# Altium footprint library My Library.PcbLib: 872 footprints (part 38 of 55)
Each footprint in its own frame and in the unit in brackets; x right, y up, seen from the top. Pads: shape width x height; smd on the part's side, far side on the other; paste and mask are expansions set on the pad; w line width, h text height; cw(c..) or ccw(c..) is an arc to the next point about the centre after c.
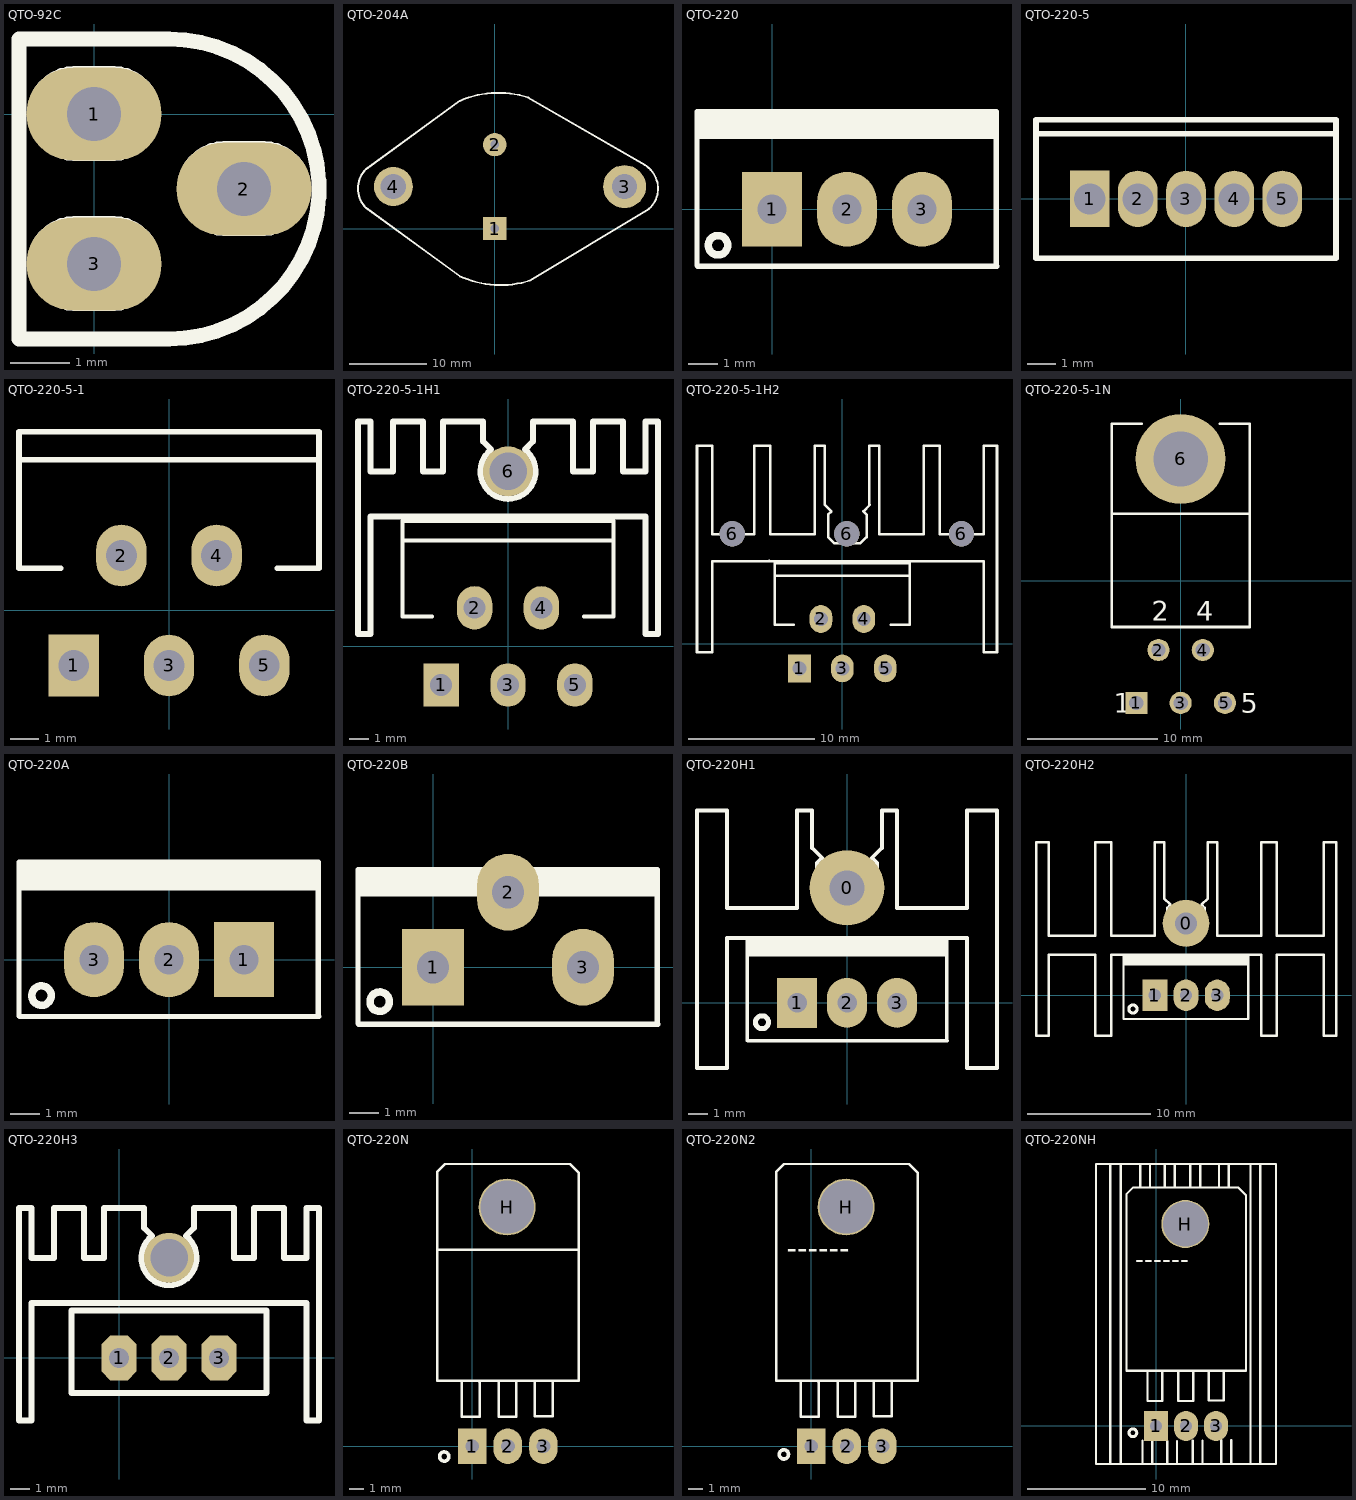
[diagram p37: the footprints below, top view; thin cyan lines are the x and y axes]

## QTO-92C [mil]
pads (3):
  oval 90x62 hole 36: 1(0,0) 2(100,-50) 3(0,-100)
Top Overlay:
  lines w10: -50,-150 -50,50 0,50 50,50 cw(c50,-50) 50,-150 0,-150 -50,-150 ; -13,-126.25 cw(c-13,-99.63) -13,-73 13,-73 cw(c13,-99.63) 13,-126.25 -13,-126.25 ; -13,-26.25 cw(c-13,0.37) -13,27 13,27 cw(c13,0.37) 13,-26.25 -13,-26.25 ; 87,-76.25 cw(c87,-49.63) 87,-23 113,-23 cw(c113,-49.63) 113,-76.25 87,-76.25

## QTO-204A [mil] "Pin For 2N3055, 2N2955"
pads (4):
  rect 120x120 hole 45: 1(0,0)
  round 120 hole 45: 2(0,430)
  round 220 hole 130: 3(665,215)
  round 200 hole 130: 4(-520,215)
Top Overlay:
  lines w10: -660,105 cw(c-560,205) -660,305 -179.46,654.16 ; -659.88,104.89 -178.69,-244.72 ; -179.53,654.34 cw(c18.37,195.17) 171.59,671.11 ; -178.9,-245.19 ccw(c28.37,209.83) 180.47,-266.47 ; 171.46,670.71 769.34,325.52 ; 180.28,-266.15 789.88,100.13 ccw(c695,205) 769.25,325.36

## QTO-220 [mil] "TO-220 - 1-2-3"
height 200
pads (3):
  rect 80x100 hole 39: 1(0,0)
  oval 80x100 hole 39: 2(100,0) 3(200,0)
Top Overlay:
  circle w10: c-72.03,-48 r12.97
  rectangle: -99,94 300,130
  lines w7: 298,107 299,93 ; -100,-75 -99,-76 -76,-76 300,-76 299,-75 299,130 -100,130 -100,-75
3D body "SW3dPS-TO220AB.STEP": height 754.72, standoff -400, extent -119,-64 322.46,120.65

## QTO-220-5 [mm] "TO, Thru-Hole, Vertical, Heatsink Mounted; 5 In-Line Leads; Pitch 1.70 mm"
height 15.6
pads (5):
  rect 1.4x2 hole 1.1: 1(-3.4,0)
  oval 1.4x2 hole 1.1: 2(-1.7,0) 3(0,0) 4(1.7,0) 5(3.4,0)
Top Overlay:
  lines w0.2: -5.3,2.3 5.3,2.3 ; -5.3,-2.1 -5.3,2.8 5.3,2.8 5.3,-2.1 -5.3,-2.1
3D body "TO220-5 v2.STEP": height 18, standoff -9.82, extent -5.08,-2.064 5.08,2.896

## QTO-220-5-1 [mm] "TO, Thru-Hole, Vertical, Heatsink Mounted; 5 Bent Staggered Leads; Pitch 1.7mm"
height 22.1
pads (5):
  rect 1.8x2.2 hole 1.1: 1(-3.4,-1.96)
  oval 1.8x2.2 hole 1.1: 2(-1.7,1.96) 3(0,-1.96) 4(1.7,1.96) 5(3.4,-1.96)
Top Overlay:
  lines w0.2: -5.35,5.38 5.35,5.38 ; -3.854,1.51 -5.35,1.51 -5.35,6.375 5.35,6.375 5.35,1.51 3.854,1.51
3D body "TO220-5-1.STEP": height 19.5, standoff -8.78, extent -5.105,-2.105 5.095,6.452

## QTO-220-5-1H1 [mm] "TO, Thru-Hole, Vertical, Heatsink Mounted; 5 Bent Staggered Leads; Pitch 1.7mm"
height 22.1
pads (6):
  rect 1.8x2.2 hole 1.1: 1(-3.4,-1.96)
  oval 1.8x2.2 hole 1.1: 2(-1.7,1.96) 3(0,-1.96) 4(1.7,1.96) 5(3.4,-1.96)
  round 2.54 hole 1.905: 6(0,8.89)
Top Overlay:
  lines w0.2: -5.35,5.38 5.35,5.38 ; -3.854,1.51 -5.35,1.51 -5.35,6.375 5.35,6.375 5.35,1.51 3.854,1.51
  lines w0.305: -0.864,10.008 -1.27,10.414 -1.27,11.43 -3.302,11.43 -3.302,8.89 -4.318,8.89 -4.318,11.43 -5.842,11.43 -5.842,8.89 -6.985,8.89 -6.985,11.43 -7.62,11.43 -7.62,0.635 -6.985,0.635 -6.985,6.604 6.985,6.604 6.985,0.635 7.62,0.635 7.62,11.43 6.985,11.43 6.985,8.89 5.842,8.89 5.842,11.43 4.318,11.43 4.318,8.89 3.302,8.89 3.302,11.43 1.27,11.43 1.27,10.414 0.853,9.997 ; -0.854,9.995 ccw(c0,8.89) 0.858,9.993
3D body "TO220-5-1.STEP": height 21, standoff -7.28, extent -5.105,-2.105 5.095,6.452
3D body "SW3dPS-heatsink TO126.STEP": height 25, standoff -3.8, extent -7.365,1.213 7.416,12.014

## QTO-220-5-1H2 [mm] "TO, Thru-Hole, Vertical, Heatsink Mounted; 5 Bent Staggered Leads; Pitch 1.7mm"
height 22.1
pads (8):
  rect 1.8x2.2 hole 1.1: 1(-3.4,-1.96)
  oval 1.8x2.2 hole 1.1: 2(-1.7,1.96) 3(0,-1.96) 4(1.7,1.96) 5(3.4,-1.96)
  round 2 hole 2: 6(-8.725,8.712) 6(0.356,8.712) 6(9.436,8.712)
Top Overlay:
  lines w0.178: -4.712,6.553 5.423,6.553
  lines w0.2: -5.35,5.38 5.35,5.38 ; -3.854,1.51 -5.35,1.51 -5.35,6.375 5.35,6.375 5.35,1.51 3.854,1.51
  lines w0.203: -5.779,6.579 -5.804,6.553 -10.325,6.553 -10.325,-0.66 -11.519,-0.66 -11.519,15.697 -10.325,15.697 -10.325,8.661 -6.998,8.661 -6.998,15.697 -5.728,15.697 -5.728,8.661 -2.172,8.661 -2.172,15.697 -1.41,15.697 -1.41,10.998 ; -5.728,6.553 6.464,6.553 ; -1.384,10.998 -0.876,10.49 -1.13,10.236 -1.13,8.458 -0.622,7.95 1.41,7.95 1.918,8.458 1.918,10.236 1.664,10.49 2.172,10.998 ; 2.146,10.973 2.146,15.697 2.908,15.697 2.908,8.661 6.464,8.661 6.464,15.697 7.734,15.697 7.734,8.661 11.189,8.661 11.189,15.697 12.255,15.697 12.255,-0.66 11.189,-0.66 11.189,6.553 6.464,6.553 ; 6.439,6.528 6.464,6.553
3D body "TO220-5-1.STEP": height 19.5, standoff -8.78, extent -5.105,-2.105 5.095,6.452
3D body "User Library-heat sink-1.STEP": height 28.87, standoff -1.75, extent -11.036,-0.682 11.864,15.718

## QTO-220-5-1N [mm] "TO, Thru-Hole, Horizontal, Heatsink Mounted; 5 Bent Staggered Leads; Pitch 1.7 mm"
height 4.6
pads (6):
  rect 1.7x1.7 hole 1.1: 1(-3.4,-9.365)
  round 1.7 hole 1.1: 2(-1.7,-5.305) 3(0,-9.365) 4(1.7,-5.305) 5(3.4,-9.365)
  round 6.9 hole 4.2: 6(0,9.365)
Top Overlay:
  lines w0.2: -5.3,5.165 5.3,5.165 ; -3,12.065 -5.3,12.065 -5.3,-3.535 5.3,-3.535 5.3,12.065 3,12.065
  text "1" at -5.125,-10.115 h1.5
  text "5" at 4.625,-10.115 h1.5
  text "4" at 1.2,-3.06 h1.5
  text "2" at -2.2,-3.06 h1.5

## QTO-220A [mil] "TO-220 - 3-2-1"
height 200
pads (3):
  rect 80x100 hole 39: 1(100,0)
  oval 80x100 hole 39: 2(0,0) 3(-100,0)
Top Overlay:
  circle w10: c-170.03,-48 r12.97
  rectangle: -200,92 199,131
  lines w7: 198,107 199,93 ; -200,-75 -199,-76 -176,-76 200,-76 199,-75 199,130 -200,130 -200,-75
3D body "User Library-TO-220-1.STEP": height 760.24, standoff -372.83, extent -194.89,-81 194.88,96.16

## QTO-220B [mm] "TO-220 - 1-2-3"
height 5.08
pads (3):
  rect 2.1x2.6 hole 1.1: 1(0,0)
  oval 2.1x2.6 hole 1.1: 2(2.54,2.54) 3(5.08,0)
Top Overlay:
  circle w0.254: c-1.804,-1.168 r0.329
  rectangle: -2.515,2.388 7.62,3.302
  lines w0.178: 7.569,2.718 7.595,2.362 ; -2.54,-1.905 -2.54,3.302 7.595,3.302 7.595,-1.905 7.62,-1.93 -1.93,-1.93 -2.515,-1.93 -2.54,-1.905
3D body "User Library-TO-220-1.STEP": height 20.58, standoff -8.2, extent -2.356,-2.062 7.544,2.438

## QTO-220H1 [mil] "TO-220 - 1-2-3"
height 200
pads (4):
  round 150 hole 70: 0(0,230)
  rect 80x100 hole 39: 1(-100,0)
  oval 80x100 hole 39: 2(0,0) 3(100,0)
Top Overlay:
  circle w10: c-170.03,-39 r12.97
  rectangle: -201,93 198,129
  lines w7: -200,100 198.5,100 199,93 ; -200,-75 -200,130 199,130 199,-75 200,-76 -176,-76 -199,-76 -200,-75
  lines w8: -300,-130 -240,-130 -240,130 240,130 240,-130 300,-130 300,385 240,385 240,190 100,190 100,385 70,385 70,310 50,290 60,280 60,210 40,190 -40,190 -60,210 -60,280 -50,290 -70,310 -70,385 -100,385 -100,190 -240,190 -240,385 -300,385 -300,-130
3D body "User Library-TO-220-1.STEP": height 850.24, standoff -282.83, extent -194.88,-82 194.88,95.17
3D body "User Library-Disipador 34M8491-1.STEP": height 1000, standoff -122.05, extent -246,73.03 250.06,328.97

## QTO-220H2 [mil] "TO-220 - 1-2-3"
height 200
pads (4):
  round 150 hole 70: 0(0,230)
  rect 80x100 hole 39: 1(-100,0)
  oval 80x100 hole 39: 2(0,0) 3(100,0)
Top Overlay:
  circle w10: c-169.97,-44 r12.97
  rectangle: -201,95 198,131
  lines w7: -200,100 198.5,100 199,93 ; -200,-75 -200,130 199,130 199,-75 200,-76 -176,-76 -199,-76 -200,-75
  lines w8: -480,-130 -440,-130 -440,130 -290,130 -290,-130 -240,-130 -240,130 240,130 240,-130 290,-130 290,130 440,130 440,-130 480,-130 480,490 440,490 440,190 290,190 290,490 240,490 240,190 100,190 100,490 70,490 70,310 50,290 60,280 60,210 40,190 -40,190 -60,210 -60,280 -50,290 -70,310 -70,490 -100,490 -100,190 -240,190 -240,490 -290,490 -290,190 -440,190 -440,490 -480,490 -480,-130
3D body "User Library-heat sink-1.STEP": height 1205.51, standoff 0, extent -448.79,-177 452.79,468.67
3D body "User Library-TO-220-1.STEP": height 810.24, standoff -322.83, extent -194.76,-82.17 195,95

## QTO-220H3 [mil] "TO-220 1-2-3"
pads (4):
  oct 70x90 hole 40: 1(0,0) 2(100,0) 3(200,0)
  round 100 hole 75: ""(100,200)
Top Overlay:
  lines w12: 66,244 50,260 50,300 -30,300 -30,200 -70,200 -70,300 -130,300 -130,200 -175,200 -175,300 -200,300 -200,-125 -175,-125 -175,110 375,110 375,-125 400,-125 400,300 375,300 375,200 330,200 330,300 270,300 270,200 230,200 230,300 150,300 150,260 133.59,243.59 ; 66.37,243.52 ccw(c100,200) 133.77,243.41 ; -95,-70 -95,95 295,95 295,-70 -95,-70
3D body "SW3dPS-heatsink TO126.STEP": height 984.25, standoff -149.61, extent -189.97,-102.25 391.97,323
3D body "User Library-TO-220-1.STEP": height 322.83, standoff -810.24, extent -96.88,-76.17 292.88,101

## QTO-220N [mil] "TO-220 - 1-2-3"
height 200
pads (4):
  rect 80x100 hole 39: 1(0,0)
  oval 80x100 hole 39: 2(100,0) 3(200,0)
  round 160 hole 150: H(98,673)
Top Overlay:
  circle w10: c-79.03,-29 r12.97
  lines w7: -99,549 -99,772 -77,794 275,794 300,769 300,730 ; -99,552 -99,184 300,184 300,553 -98,553 ; -29,178 -29,83 21,83 21,180 20,181 ; 74,178 74,83 124,83 124,180 123,181 ; 176,180 176,85 226,85 226,182 225,183 ; 300,552 300,733
3D body "SW3dPS-mje-700 and 800.STEP": height 121, standoff -160, extent -48,-10.31 252,792.31

## QTO-220N2 [mil] "TO-220 - 1-2-3"
height 200
pads (4):
  rect 80x100 hole 39: 1(0,0)
  oval 80x100 hole 39: 2(100,0) 3(200,0)
  round 160 hole 150: H(98,673)
Top Overlay:
  circle w10: c-77.03,-23 r12.97
  lines w7: -99,549 -99,772 -77,794 275,794 300,769 300,730 ; -99,552 -99,184 300,184 300,553 ; -29,178 -29,83 21,83 21,180 20,181 ; 74,178 74,83 124,83 124,180 123,181 ; 176,180 176,85 226,85 226,182 225,183 ; 300,552 300,733
  text "------" at -69,527 h60
3D body "SW3DPS-TO-220-DEFAULT.STEP": height 165.35, standoff -118.11, extent -100,-3.66 300,763.66

## QTO-220NH [mil] "TO-220 - 1-2-3"
height 200
pads (4):
  rect 80x100 hole 39: 1(0,0)
  oval 80x100 hole 39: 2(100,0) 3(200,0)
  round 160 hole 150: H(98,673)
Top Overlay:
  circle w10: c-77.03,-23 r12.97
  lines w7: -99,549 -99,772 -77,794 275,794 300,769 300,730 ; -99,552 -99,184 300,184 300,553 ; -29,178 -29,83 21,83 21,180 20,181 ; 74,178 74,83 124,83 124,180 123,181 ; 176,180 176,85 226,85 226,182 225,183 ; 300,552 300,733
  lines w8: -152,-127 -152,873 ; -117,-127 -117,873 ; -53,796 -53.01,869.97 ; -45,-124 -45.01,-50.03 ; -20,796 -20.01,869.97 ; -12,-124 -12.01,-50.03 ; 29,795 28.99,868.97 ; 37,-125 36.99,-51.03 ; 62,795 61.99,868.97 ; 70,-125 69.99,-51.03 ; 114,796 113.99,869.97 ; 122,-124 121.99,-50.03 ; 147,796 146.99,869.97 ; 155,-124 154.99,-50.03 ; 210,798 209.99,871.97 ; 218,-122 217.99,-48.03 ; 243,798 242.99,871.97 ; 251,-122 250.99,-48.03 ; 315,-127 315,873 ; 348,-127 348,873 ; -200,-127 400,-127 400,873 -200,873 -200,-127
  text "------" at -69,527 h60
3D body "SW3DPS-TO-220-DEFAULT.STEP": height 165.35, standoff -118.11, extent -100,-3.66 300,763.66